# Altium footprint library Connectors_THT.PcbLib: 111 footprints (part 1 of 11)
Each footprint in its own frame and in the unit in brackets; x right, y up, seen from the top. Pads: shape width x height; smd on the part's side, far side on the other; paste and mask are expansions set on the pad; w line width, h text height; cw(c..) or ccw(c..) is an arc to the next point about the centre after c.
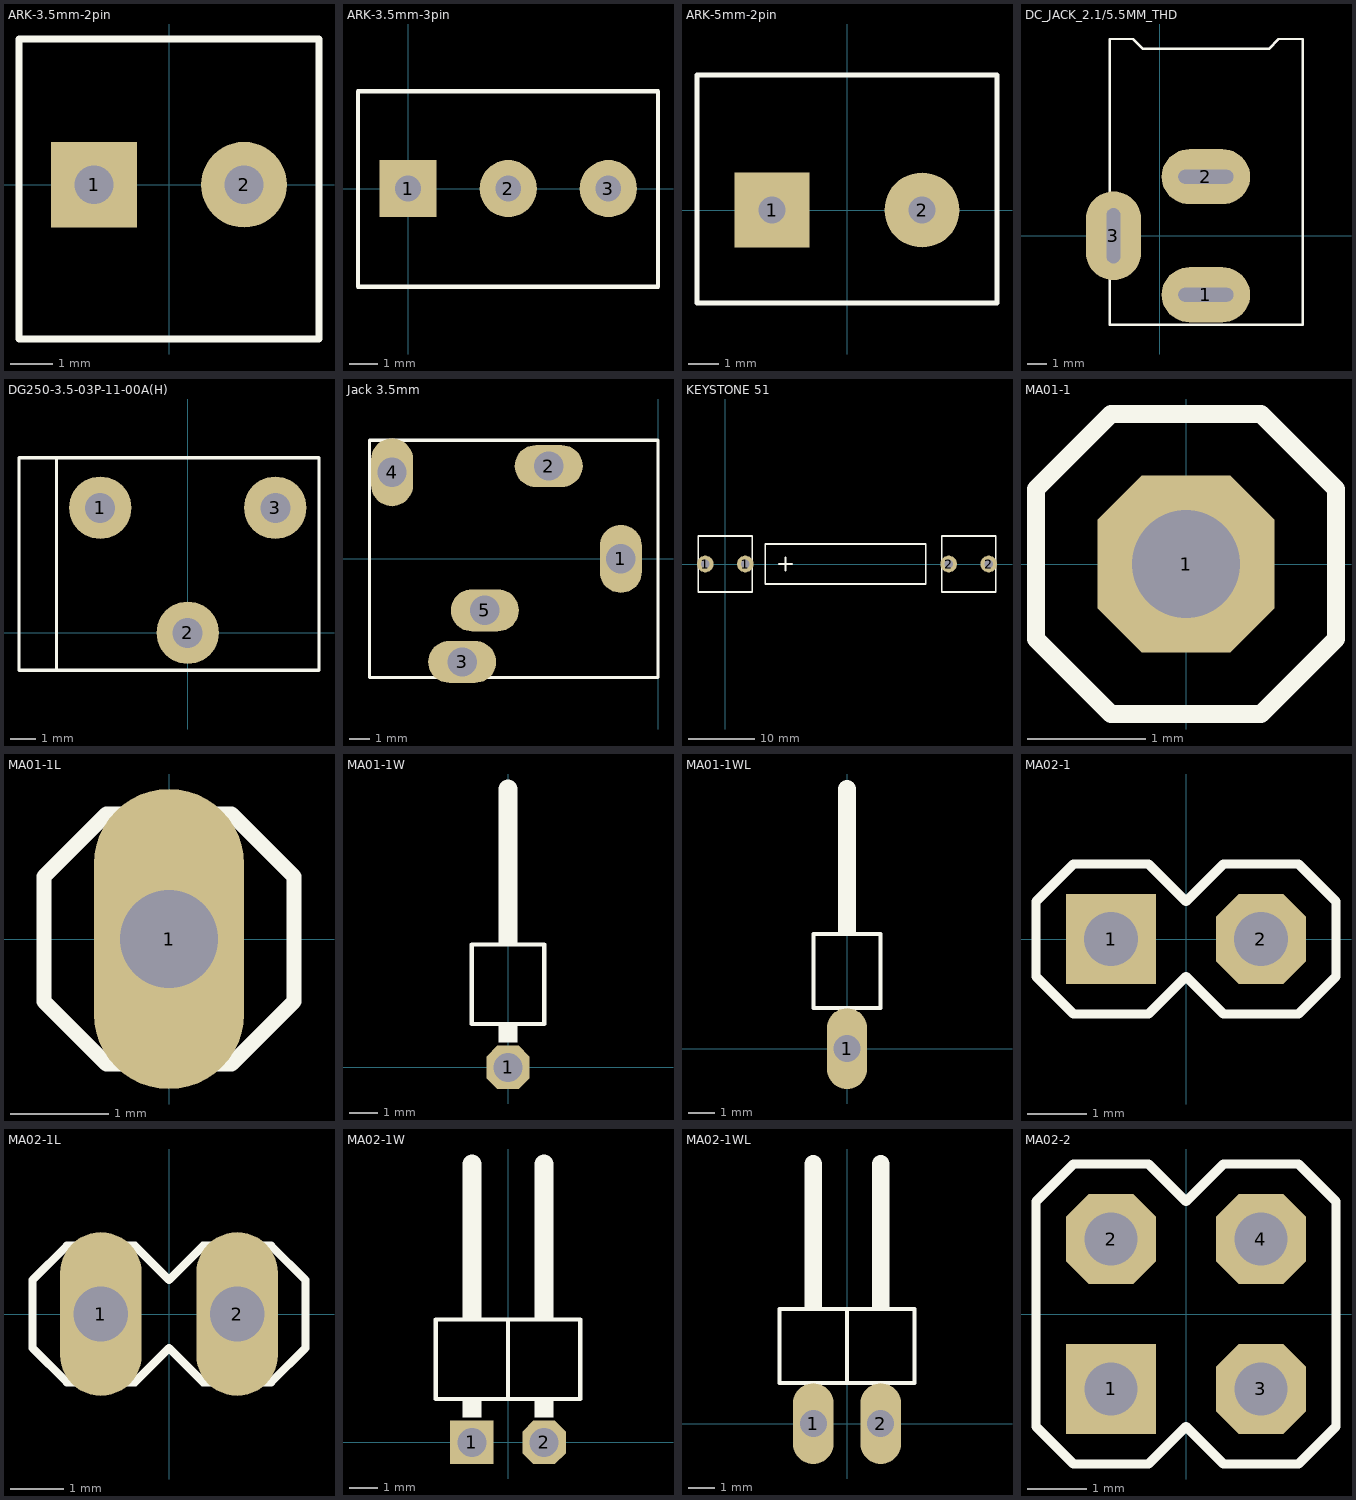
[diagram p0: the footprints below, top view; thin cyan lines are the x and y axes]

## ARK-3.5mm-2pin [mm]
pads (2):
  rect 2x2 hole 0.9: 1(-1.75,0)
  round 2 hole 0.9: 2(1.75,0)
Top Overlay:
  lines w0.152: -3.5,-3.6 3.5,-3.6 3.5,3.4 -3.5,3.4 -3.5,-3.6
3D body: height 8.4, standoff -3.8, extent -3.5,-3.6 3.5,3.4

## ARK-3.5mm-3pin [mm]
pads (3):
  rect 2x2 hole 0.9: 1(0,0)
  round 2 hole 0.9: 2(3.5,0) 3(7,0)
Top Overlay:
  lines w0.152: -1.75,-3.429 8.735,-3.429 8.735,3.4 -1.75,3.4 -1.75,-3.429
3D body: height 2.1, standoff -9.3, extent -1.765,-3.429 8.735,3.471

## ARK-5mm-2pin [mm]
pads (2):
  rect 2.5x2.5 hole 0.9: 1(-2.5,0)
  round 2.5 hole 0.9: 2(2.5,0)
Top Overlay:
  lines w0.152: -5,-3.1 -5,4.5 5,4.5 5,-3.1 -5,-3.1
3D body: height 10, standoff -3.5, extent -5.585,-4.05 4.985,4.1

## DC_JACK_2.1/5.5MM_THD [mm]
height 11
pads (3):
  oval 4.5x2.8 hole 0.7 slot 2.8 at 0 deg: 1(2.35,-3) 2(2.35,3)
  oval 2.8x4.5 hole 0.7 slot 2.8 at 90 deg: 3(-2.35,0)
Top Overlay:
  lines w0.127: -2.55,-1.7 -2.55,-4.525 7.275,-4.525 7.275,10 6.05,10 5.55,9.5 -0.85,9.5 -1.35,10 -2.55,10 -2.55,1.7
Mechanical 13:
  lines w0.076: -2.55,-1.7 -2.55,-4.525 7.275,-4.525 7.275,10 6.05,10 5.55,9.5 -0.85,9.5 -1.35,10 -2.55,10 -2.55,1.7
3D body: height 11, standoff -3.5, extent -2.55,-3.4 6.85,10.7

## DG250-3.5-03P-11-00A(H) [mm]
pads (3):
  round 2.5 hole 1.2: 1(-3.5,5) 2(0,0) 3(3.5,5)
Top Overlay:
  lines w0.125: -6.5,7 -5,7 ; -5.25,-1.5 -5.25,7 ; -6.75,-1.5 -6.75,7 5.25,7 5.25,-1.5 -6.75,-1.5
3D body: height 0, standoff -3.6, extent -3.872,4.626 -3.125,5.374
3D body: height 0, standoff -3.6, extent 3.128,4.626 3.875,5.374
3D body: height 0, standoff -3.6, extent -0.372,-0.374 0.375,0.374
3D body: height 11, standoff 0, extent -6.75,2.75 5.25,7
3D body: height 11, standoff 0, extent -6.75,2 5.25,2.75
3D body: height 8.5, standoff 0, extent -6.75,0.5 5.25,1.25
3D body: height 7.5, standoff 0, extent -6.75,-1.5 5.25,0.5
3D body: height 10, standoff 0, extent -6.75,1.25 5.25,2
3D body: height 8.6, standoff 0.6, extent -4.988,-1.247 -2,1.747
3D body: height 8.6, standoff 0.6, extent -1.488,-1.247 1.5,1.747
3D body: height 8.6, standoff 0.6, extent 2.012,-1.247 5,1.747
3D body: height 12, standoff 1, extent 2.54,3.81 4.445,5.715
3D body: height 12, standoff 1, extent -0.96,3.89 0.945,5.795
3D body: height 12, standoff 1, extent -4.46,3.81 -2.555,5.715

## Jack 3.5mm [mil]
height 236.22
pads (5):
  oval 80x130 hole 56: 1(-70.87,0) 4(-507.87,165.35)
  oval 130x80 hole 56: 2(-208.67,177.17) 3(-374.02,-196.85) 5(-330.71,-98.43)
Top Overlay:
  lines w6: -551.18,-226.38 -551.18,226.38 0,226.38 0,-226.38 -551.18,-226.38
3D body: height 236.22, standoff -118.11, extent -551.18,-226.38 137.8,226.38

## KEYSTONE 51 [mm]
pads (4):
  round 2.5 hole 1.3: 1(-3,0) 1(3,0) 2(33.45,0) 2(39.45,0)
Top Overlay:
  lines w0.25: 8,0 10,0 ; 9,-1 9,1 ; -4.05,-4.2 4.05,-4.2 4.05,4.2 -4.05,4.2 ; -4.05,-4.2 -4.05,4.2 ; -4.05,-4.2 -4.05,4.2 ; 40.5,-4.2 40.5,4.2 ; 40.5,-4.2 32.4,-4.2 32.4,4.2 40.5,4.2 ; 40.5,-4.2 40.5,4.2 ; 6,-3 6,3 30,3 30,-3 9,-3 6,-3

## MA01-1 [mm]
pads (1):
  oct 1.5x1.5 hole 0.914: 1(0,0)
Top Overlay:
  lines w0.152: -1.27,-0.635 -1.27,0.635 -0.635,1.27 0.635,1.27 1.27,0.635 1.27,-0.635 0.635,-1.27 -0.635,-1.27 -1.27,-0.635
3D body: height 0.8, standoff 0, extent -0.317,-0.317 0.318,0.318
3D body: height 0.3, standoff 0, extent -1.27,0.635 1.27,1.27
3D body: height 0.3, standoff 0, extent -1.27,-1.27 1.27,-0.635
3D body: height 2.5, standoff 0.3, extent -1.27,-1.27 1.27,1.27
3D body: height 8.6, standoff 0, extent -0.317,-0.317 0.318,0.318

## MA01-1L [mil]
pads (1):
  oval 60x120 hole 39.37: 1(0,0)
Top Overlay:
  lines w6: -50,-25 -50,25 -25,50 25,50 50,25 50,-25 25,-50 -25,-50 -50,-25
3D body: height 31.5, standoff 0, extent -12.5,-12.5 12.5,12.5
3D body: height 11.81, standoff 0, extent -50,25 50,50
3D body: height 11.81, standoff 0, extent -50,-50 50,-25
3D body: height 98.43, standoff 11.81, extent -50,-50 50,50
3D body: height 338.58, standoff 0, extent -12.5,-12.5 12.5,12.5

## MA01-1W [mil]
pads (1):
  oct 60x60 hole 40: 1(0,0)
Top Overlay:
  rectangle: -13,170 13,200
  rectangle: -13,34 13,60
  lines w6: -50,60 50,60 50,170 -50,170 -50,60
  lines w26: 0,200 0,385
3D body: height 31.5, standoff 0, extent -12.49,-12.5 12.51,12.5
3D body: height 62.48, standoff 0, extent -12.49,-12.49 12.51,12.51
3D body: height 100, standoff 0, extent -50,60 50,170
3D body: height 62.5, standoff 37.5, extent -12.5,-12.49 12.5,393.75

## MA01-1WL [mil]
pads (1):
  oval 60x120 hole 40: 1(0,0)
Top Overlay:
  rectangle: -13,170 13,200
  rectangle: -13,34 13,60
  lines w6: -50,60 50,60 50,170 -50,170 -50,60
  lines w26: 0,200 0,385
3D body: height 31.5, standoff 0, extent -12.49,-12.5 12.51,12.5
3D body: height 62.48, standoff 0, extent -12.49,-12.49 12.51,12.51
3D body: height 100, standoff 0, extent -50,60 50,170
3D body: height 62.5, standoff 37.5, extent -12.5,-12.49 12.5,393.75

## MA02-1 [mil]
pads (2):
  rect 60x60 hole 35.98: 1(-50,0)
  oct 60x60 hole 35.98: 2(50,0)
Top Overlay:
  lines w6: -100,-25 -75,-50 -25,-50 0,-25 25,-50 75,-50 100,-25 100,25 75,50 25,50 0,25 -25,50 -75,50 -100,25 -100,-25
3D body: height 31.5, standoff 0, extent -62.5,-12.5 -37.5,12.5
3D body: height 11.81, standoff 0, extent -100,25 0,50
3D body: height 11.81, standoff 0, extent -100,-50 0,-25
3D body: height 98.43, standoff 11.81, extent -100,-50 0,50
3D body: height 338.58, standoff 0, extent -62.49,-12.49 -37.49,12.51
3D body: height 31.5, standoff 0, extent 37.5,-12.5 62.5,12.5
3D body: height 11.81, standoff 0, extent 0,25 100,50
3D body: height 11.81, standoff 0, extent 0,-50 100,-25
3D body: height 98.43, standoff 11.81, extent 0,-50 100,50
3D body: height 338.58, standoff 0, extent 37.51,-12.49 62.51,12.51

## MA02-1L [mil]
pads (2):
  oval 60x120 hole 40: 1(-50,0) 2(50,0)
Top Overlay:
  lines w6: -100,-25 -75,-50 -25,-50 0,-25 25,-50 75,-50 100,-25 100,25 75,50 25,50 0,25 -25,50 -75,50 -100,25 -100,-25
3D body: height 338.58, standoff 0, extent 37.51,-12.49 62.51,12.51
3D body: height 98.43, standoff 11.81, extent 0,-50 100,50
3D body: height 11.81, standoff 0, extent 0,-50 100,-25
3D body: height 11.81, standoff 0, extent 0,25 100,50
3D body: height 31.5, standoff 0, extent 37.5,-12.5 62.5,12.5
3D body: height 338.58, standoff 0, extent -62.49,-12.49 -37.49,12.51
3D body: height 98.43, standoff 11.81, extent -100,-50 0,50
3D body: height 11.81, standoff 0, extent -100,-50 0,-25
3D body: height 11.81, standoff 0, extent -100,25 0,50
3D body: height 31.5, standoff 0, extent -62.5,-12.5 -37.5,12.5

## MA02-1W [mil]
pads (2):
  rect 60x60 hole 40: 1(-50,0)
  oct 60x60 hole 40: 2(50,0)
Top Overlay:
  rectangle: -63,170 -37,200
  rectangle: 37,170 63,200
  rectangle: 37,34 63,60
  rectangle: -63,34 -37,60
  lines w6: 0,60 0,170 ; 0,60 -100,60 -100,170 0,170 ; 0,60 100,60 100,170 0,170
  lines w26: -50,200 -50,385 ; 50,200 50,385
3D body: height 31.5, standoff 0, extent 37.51,-12.49 62.51,12.51
3D body: height 31.5, standoff 0, extent -62.49,-12.5 -37.49,12.5
3D body: height 62.48, standoff 0, extent -62.49,-12.49 -37.49,12.51
3D body: height 100, standoff 0, extent -100,60 0,170
3D body: height 62.5, standoff 37.5, extent -62.5,-12.49 -37.5,393.75
3D body: height 62.5, standoff 37.5, extent 37.51,-12.49 62.51,393.76
3D body: height 100, standoff 0, extent 0,60 100,170
3D body: height 62.48, standoff 0, extent 37.51,-12.49 62.51,12.51

## MA02-1WL [mil]
pads (2):
  oval 60x120 hole 40: 1(-50,0) 2(50,0)
Top Overlay:
  rectangle: -63,170 -37,200
  rectangle: 37,170 63,200
  rectangle: 37,34 63,60
  rectangle: -63,34 -37,60
  lines w6: 0,60 0,170 ; 0,60 -100,60 -100,170 0,170 ; 0,60 100,60 100,170 0,170
  lines w26: -50,200 -50,385 ; 50,200 50,385
3D body: height 31.5, standoff 0, extent 37.51,-12.49 62.51,12.51
3D body: height 31.5, standoff 0, extent -62.49,-12.5 -37.49,12.5
3D body: height 62.48, standoff 0, extent -62.49,-12.49 -37.49,12.51
3D body: height 100, standoff 0, extent -100,60 0,170
3D body: height 62.5, standoff 37.5, extent -62.5,-12.49 -37.5,393.75
3D body: height 62.5, standoff 37.5, extent 37.51,-12.49 62.51,393.76
3D body: height 100, standoff 0, extent 0,60 100,170
3D body: height 62.48, standoff 0, extent 37.51,-12.49 62.51,12.51

## MA02-2 [mil]
pads (4):
  rect 60x60 hole 35.43: 1(-50,-50)
  oct 60x60 hole 35.43: 2(-50,50) 3(50,-50) 4(50,50)
Top Overlay:
  lines w6: -100,-75 -100,75 -75,100 -25,100 0,75 25,100 75,100 100,75 100,-75 75,-100 25,-100 0,-75 -25,-100 -75,-100 -100,-75
3D body: height 31.5, standoff 0, extent 37.51,37.51 62.51,62.51
3D body: height 338.58, standoff 0, extent 37.51,-62.49 62.51,-37.49
3D body: height 11.81, standoff 0, extent 0,-100 100,-75
3D body: height 11.81, standoff 0, extent 0,75 100,100
3D body: height 98.43, standoff 11.81, extent 0,-100 100,100
3D body: height 338.58, standoff 0, extent 37.51,37.51 62.51,62.51
3D body: height 31.5, standoff 0, extent 37.51,-62.49 62.51,-37.49
3D body: height 31.5, standoff 0, extent -62.5,-62.5 -37.5,-37.5
3D body: height 338.58, standoff 0, extent -62.49,37.51 -37.49,62.51
3D body: height 98.43, standoff 11.81, extent -100,-100 0,100
3D body: height 11.81, standoff 0, extent -100,75 0,100
3D body: height 11.81, standoff 0, extent -100,-100 0,-75
3D body: height 338.58, standoff 0, extent -62.5,-62.5 -37.5,-37.5
3D body: height 31.5, standoff 0, extent -62.5,37.5 -37.5,62.5